# Altium footprint library 常用连接件.PcbLib: 38 footprints (part 2 of 3)
Each footprint in its own frame and in the unit in brackets; x right, y up, seen from the top. Pads: shape width x height; smd on the part's side, far side on the other; paste and mask are expansions set on the pad; w line width, h text height; cw(c..) or ccw(c..) is an arc to the next point about the centre after c.
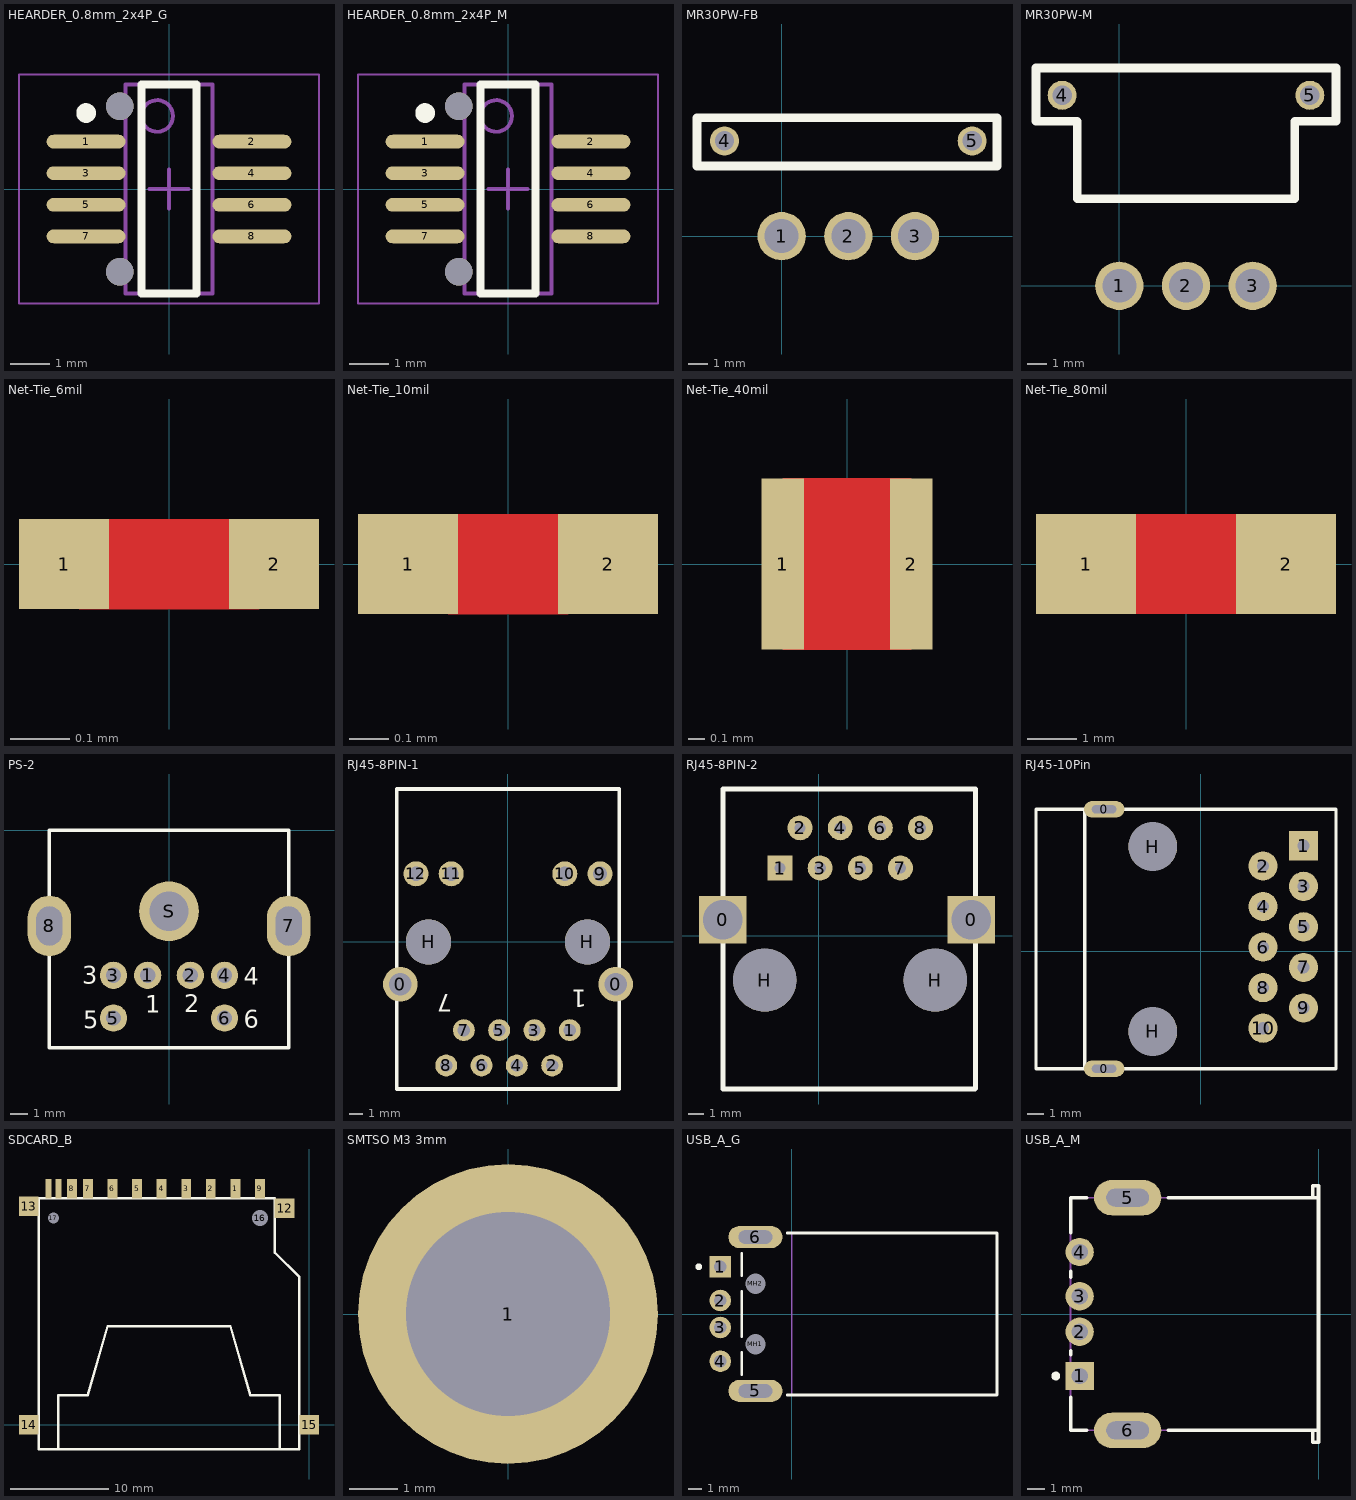
[diagram p1: the footprints below, top view; thin cyan lines are the x and y axes]

## HEARDER_0.8mm_2x4P_G [mm] "0.8间距2x4P公座，SMD"
height 2
pads (8):
  oval 2x0.35 smd: 1(-2.1,1.2) 2(2.1,1.2) 3(-2.1,0.4) 4(2.1,0.4) 5(-2.1,-0.4) 6(2.1,-0.4) 7(-2.1,-1.2) 8(2.1,-1.2)
via -1.25,-2.1 diameter 0.7 hole 0.7
via -1.25,2.1 diameter 0.7 hole 0.7
Top Overlay:
  circle w0.25: c-2.1,1.925 r0.125
  lines w0.2: -0.7,-2.65 -0.7,2.65 0.7,2.65 0.7,-2.65 -0.7,-2.65
Mechanical 13:
  circle w0.1: c-0.3,1.85 r0.4
  lines w0.1: -1.1,-2.65 -1.1,2.65 1.1,2.65 1.1,-2.65 -1.1,-2.65
Mechanical 15:
  lines w0.05: -3.8,-2.9 -3.8,2.9 3.8,2.9 3.8,-2.9 -3.8,-2.9
  lines w0.1: -0.5,0 0.5,0 ; 0,-0.5 0,0.5
3D body "SG340-GxxP-B1-2x4.STEP": height 6, standoff -0.5, extent -2.493,-2.535 2.467,2.565

## HEARDER_0.8mm_2x4P_M [mm] "0.8间距2x4P公座，SMD"
height 2
pads (8):
  oval 2x0.35 smd: 1(-2.1,1.2) 2(2.1,1.2) 3(-2.1,0.4) 4(2.1,0.4) 5(-2.1,-0.4) 6(2.1,-0.4) 7(-2.1,-1.2) 8(2.1,-1.2)
via -1.25,-2.1 diameter 0.7 hole 0.7
via -1.25,2.1 diameter 0.7 hole 0.7
Top Overlay:
  circle w0.25: c-2.1,1.925 r0.125
  lines w0.2: -0.7,-2.65 -0.7,2.65 0.7,2.65 0.7,-2.65 -0.7,-2.65
Mechanical 13:
  circle w0.1: c-0.3,1.85 r0.4
  lines w0.1: -1.1,-2.65 -1.1,2.65 1.1,2.65 1.1,-2.65 -1.1,-2.65
Mechanical 15:
  lines w0.05: -3.8,-2.9 -3.8,2.9 3.8,2.9 3.8,-2.9 -3.8,-2.9
  lines w0.1: -0.5,0 0.5,0 ; 0,-0.5 0,0.5
3D body "SG340-GxxP-B1-2x4.STEP": height 4.1, standoff -0.5, extent -2.5,-2.55 2.5,2.55

## MR30PW-FB [mil]
pads (5):
  round 100 hole 70: 1(0,0) 2(137.79,0) 3(275.59,0)
  round 60 hole 40: 4(-118.11,196.85) 5(393.7,196.85)
Top Overlay:
  lines w18: -175,145 -175,245 445,245 445,145 -175,145
3D body "Amass MR30PW-FB.STEP": height 196.85, standoff -76.77, extent -168.14,-32.67 438.15,536.23

## MR30PW-M [mil]
pads (5):
  round 100 hole 70: 1(0,0) 2(137.79,0) 3(275.59,0)
  round 60 hole 40: 4(-118.11,393.71) 5(393.7,393.71)
Top Overlay:
  lines w18: -172.2,340.01 -87.2,340.01 -87.2,180.01 362.8,180.01 362.8,340.01 447.8,340.01 447.8,450.01 -172.2,450.01 -172.2,340.01
3D body "User Library-MR30PW-M.step": height 195.08, standoff -79.06, extent -177.36,-34.99 452.95,535.44

## Net-Tie_6mil [mil]
pads (2):
  rect 6x6 smd paste-5 mask-5: 1(-7,0) 2(7,0)
Top Layer:
  region: -6,3 6,3 6,-3 -6,-3

## Net-Tie_10mil [mil]
pads (2):
  rect 10x10 smd paste-5 mask-5: 1(-10,0) 2(10,0)
Top Layer:
  region: -6,5 6,5 6,-5 -6,-5

## Net-Tie_40mil [mil]
pads (2):
  rect 10x40 smd paste-5 mask-5: 1(-15,0) 2(15,0)
Top Layer:
  region: -15,20 15,20 15,-20 -15,-20

## Net-Tie_80mil [mil]
pads (2):
  rect 80x80 smd paste-5 mask-40: 1(-80,0) 2(80,0)
Top Layer:
  region: -45,40 45,40 45,-40 -45,-40

## PS-2 [mm]
pads (9):
  round 1.6 hole 0.9: 1(-1.25,-8.5) 2(1.25,-8.5) 3(-3.25,-8.5) 4(3.25,-8.5) 5(-3.25,-11) 6(3.25,-11)
  oval 2.54x3.556 hole 1.524 slot 2.286 at 90 deg: 7(7,-5.613) 8(-7,-5.613)
  round 3.5 hole 2.3: S(0,-4.75)
Top Overlay:
  lines w0.2: -7,-12.75 -7,0 7,0 7,-12.75 -7,-12.75
  text "1" at -1.397,-10.693 h1.02
  text "3" at -5.08,-8.992 h1.02
  text "4" at 4.369,-9.042 h1.02
  text "6" at 4.369,-11.557 h1.02
  text "5" at -5.029,-11.608 h1.02
  text "2" at 0.889,-10.668 h1.02
3D body: height 10, standoff 0, extent -7.1,-12.85 7.1,0.1

## RJ45-8PIN-1 [mm] "带指示灯的8Pin水晶头坐"
pads (16):
  round 2.5 hole 1.63: 0(-7.741,-3.045) 0(7.749,-3.045)
  round 1.575 hole 0.889: 1(4.449,-6.345) 2(3.179,-8.885) 3(1.909,-6.345) 4(0.639,-8.885) 5(-0.631,-6.345) 6(-1.901,-8.885) 7(-3.171,-6.345) 8(-4.441,-8.885)
  round 1.8 hole 1.02: 9(6.629,4.905) 10(4.089,4.905) 11(-4.081,4.905) 12(-6.621,4.905)
  round 3.25 hole 3.25: H(-5.711,0.005) H(5.719,0.005)
Top Overlay:
  lines w0.254: -7.996,-10.578 -7.996,11.005 8.004,11.005 8.004,-10.578 -7.996,-10.578
  text "1" at 5.664,-3.446 h1.27
  text "7" at -3.995,-3.778 h1.27

## RJ45-8PIN-2 [mil] "不带指示灯的8pin水晶头坐"
pads (12):
  rect 118.11x118.11 hole 98.42: 0(-240,40) 0(380,40)
  rect 62x62 hole 28: 1(-96.89,169.37)
  round 62 hole 28: 2(-46.89,269.37) 3(3.11,169.37) 4(53.11,269.37) 5(103.11,169.37) 6(153.11,269.37) 7(203.11,169.37) 8(253.11,269.37)
  round 157.48 hole 157.48: H(-135,-110) H(290,-110)
Top Overlay:
  lines w12: 388.78,-381.22 352.52,-381.22 -188.03,-381.22 -238.78,-381.22 -238.78,366.22 -213.78,366.22 -187.64,366.22 353.11,366.22 390,366.22 390,-380

## RJ45-10Pin [mm] "10心水晶头坐"
pads (14):
  oval 2.5x1 hole 0.5 slot 1.5 at 0 deg: 0(-5.96,-7.258) 0(-5.96,8.742)
  rect 1.8x1.8 hole 0.762: 1(6.34,6.492)
  round 1.8 hole 0.762: 2(3.84,5.242) 3(6.34,3.992) 4(3.84,2.742) 5(6.34,1.492) 6(3.84,0.242) 7(6.34,-1.008) 8(3.84,-2.258) 9(6.34,-3.508) 10(3.84,-4.758)
  round 3 hole 3: H(-2.96,-4.958) H(-2.96,6.442)
Top Overlay:
  lines w0.2: -7.16,-7.258 -7.16,8.742 ; -10.16,-7.258 8.34,-7.258 8.34,8.742 -10.16,8.742 -10.16,-7.258

## SDCARD_B [mm] "SD卡座"
pads (17):
  rect 1x2 smd: 1(-7.5,24) 2(-10,24) 3(-12.5,24) 4(-15,24) 5(-17.5,24) 6(-20,24) 7(-22.5,24) 8(-24.125,24) 9(-5,24)
  rect 0.6x2 smd: 10(-26.5,24) 11(-25.5,24)
  rect 2x2 smd: 12(-2.5,22) 13(-28.5,22.2) 14(-28.5,0) 15(0,0)
  round 1.5 hole 1.6: 16(-5,21)
  round 1 hole 1.1: 17(-26,21)
Top Overlay:
  lines w0.254: -25.5,-2.5 -25.5,3 -22.5,3 -20.5,10 -8,10 -6,3 -3,3 -3,-2 -3,-2.428 ; -27.5,-2.5 -1,-2.5 -1,-2 -1,15 -3.5,17.5 -3.5,23 -27.5,23 -27.5,-2 -27.5,-2.5

## SMTSO M3 3mm [mm]
pads (1):
  round 6.2 hole 4.22: 1(0,0)
3D body "User Library-SMTSO-M3-3ET.x_t": height 1, standoff -3.53, extent -2.78,-2.78 2.78,2.78

## USB_A_G [mm] "A型USB 普通USB 公头"
height 4.5
pads (8):
  rect 1.6x1.6 hole 0.92: 1(-5.3,3.5)
  round 1.6 hole 0.92: 2(-5.3,1) 3(-5.3,-1) 4(-5.3,-3.5)
  oval 4x1.65 hole 1 slot 2.5 at 0 deg: 5(-2.7,-5.7) 6(-2.7,5.7)
  round 1.2 hole 1.5 unplated: MH1(-2.7,-2.25) MH2(-2.7,2.25)
Top Overlay:
  circle w0.25: c-6.9,3.5 r0.125
  lines w0.2: -3.7,-4.475 -3.7,-2.83 ; -3.7,-1.68 -3.7,1.68 ; -3.7,2.83 -3.7,4.475 ; -0.33,-6 15.2,-6 15.2,6 -0.33,6
Mechanical 1:
  lines w0.1: 0,-6 0,6
  text "PCB Edge" at 0.473,-5.173 h0.25
3D body "Samtec3dPS-USB-AM.STEP": height 3.12, standoff -2.58, extent -5.334,-6.277 14.696,6.223

## USB_A_M [mm] "A型USB 普通USB 母头"
height 7.01
pads (6):
  rect 1.6x1.6 hole 0.92: 1(-13.49,-3.5)
  round 1.6 hole 0.92: 2(-13.49,-1) 3(-13.49,1) 4(-13.49,3.5)
  oval 3.8x2 hole 1 slot 2.4 at 0 deg: 5(-10.78,6.57) 6(-10.78,-6.57)
Top Overlay:
  circle w0.25: c-14.84,-3.5 r0.125
  lines w0.2: -14,-4.7 -14,-6.565 -13.08,-6.565 ; -14,-2.3 -14,-2.09 ; -14,2.09 -14,2.41 ; -14,4.59 -14,6.565 -13.08,6.565 ; -8.48,-6.565 0,-6.565 ; -8.48,6.565 0,6.565 ; -0.32,-6.565 -0.32,-7.25 0,-7.25 0,-6.565 ; -0.32,6.565 -0.32,7.25 0,7.25 0,6.565 ; 0,-6.565 0,6.565
Mechanical 13:
  lines w0.1: -14,-6.565 -14,6.565 -0.32,6.565 -0.32,7.25 0,7.25 0,-7.25 -0.32,-7.25 -0.32,-6.565 -14,-6.565
3D body "Samtec-USB-A-S-F-B-TH.STEP": height 7.47, standoff -3.46, extent -14.351,-7.849 -0.251,7.95